# Altium footprint library AltiumLibraries.PcbLib: 247 footprints (part 2 of 16)
Each footprint in its own frame and in the unit in brackets; x right, y up, seen from the top. Pads: shape width x height; smd on the part's side, far side on the other; paste and mask are expansions set on the pad; w line width, h text height; cw(c..) or ccw(c..) is an arc to the next point about the centre after c.
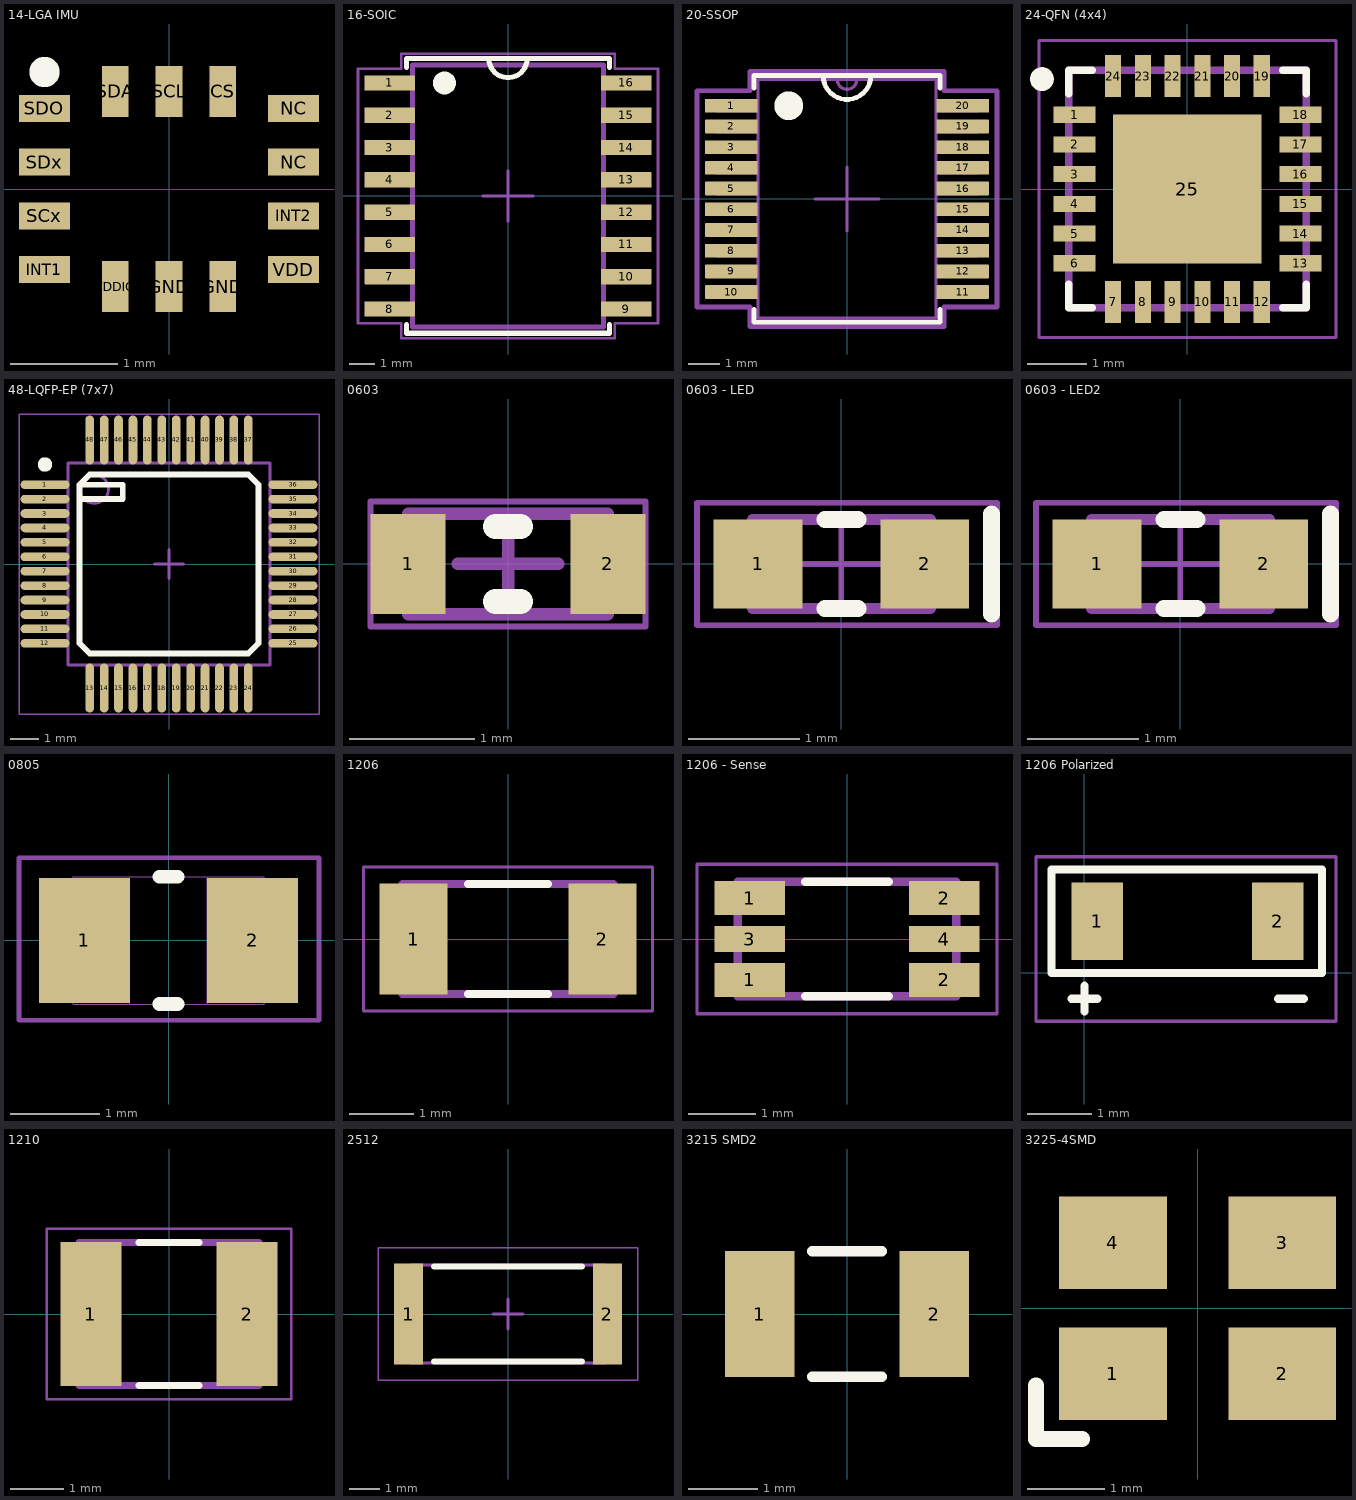
[diagram p1: the footprints below, top view; thin cyan lines are the x and y axes]

## 14-LGA IMU [mm] "Accelerometer, Gyroscope, Temperature, 6 Axis Sensor I²C, SPI Output"
height 0.86
pads (14):
  rect 0.25x0.475 smd mask+0.05: CS(0.5,0.91) GND(0,-0.91) GND(0.5,-0.91) SCL(0,0.91) SDA(-0.5,0.91) VDDIO(-0.5,-0.91)
  rect 0.475x0.25 smd mask+0.05: INT1(-1.16,-0.75) INT2(1.16,-0.25) NC(1.16,0.25) NC(1.16,0.75) SCx(-1.16,-0.25) SDO(-1.16,0.75) SDx(-1.16,0.25) VDD(1.16,-0.75)
Top Overlay:
  circle w0.254: c-1.16,1.09 r0.014
3D body: height 0.86, standoff 0.3, extent -1.5,-1.25 1.5,1.25

## 16-SOIC [mm]
pads (16):
  rrect10% 2x0.6 smd: 1(-4.65,4.445) 2(-4.65,3.175) 3(-4.65,1.905) 4(-4.65,0.635) 5(-4.65,-0.635) 6(-4.65,-1.905) 7(-4.65,-3.175) 8(-4.65,-4.445) 9(4.65,-4.445) 10(4.65,-3.175) 11(4.65,-1.905) 12(4.65,-0.635) 13(4.65,0.635) 14(4.65,1.905) 15(4.65,3.175) 16(4.65,4.445)
Top Overlay:
  circle w0.5: c-2.5,4.445 r0.2
  lines w0.2: -4,-5.05 -4,-5.4 4,-5.4 4,-5.05 ; -4,5.05 -4,5.4 4,5.4 4,5.05 ; -0.75,5.4 ccw(c0,5.4) 0.75,5.4
Mechanical 1:
  lines w0.2: -3.75,-5.15 3.75,-5.15 3.75,5.15 -3.75,5.15 -3.75,-5.15
Mechanical 15:
  lines w0.1: -1,0 0,0 ; 0,-1 0,0 ; 0,1 0,0 ; 1,0 0,0 ; -5.9,-5 -5.9,5 -4.2,5 -4.2,5.6 4.2,5.6 4.2,5 5.9,5 5.9,-5 4.2,-5 4.2,-5.6 -4.2,-5.6 -4.2,-5 -5.9,-5
3D body "DW0016A.stp": height 2.59, standoff 0, extent -5.167,-5.15 5.167,5.15

## 20-SSOP [mil]
pads (20):
  rrect10% 65x17 smd paste+0: 1(-142.92,115.16) 2(-142.92,89.57) 3(-142.92,63.98) 4(-142.92,38.39) 5(-142.92,12.8) 6(-142.92,-12.8) 7(-142.92,-38.39) 8(-142.92,-63.98) 9(-142.92,-89.57) 10(-142.92,-115.16) 11(142.92,-115.16) 12(142.92,-89.57) 13(142.92,-63.98) 14(142.92,-38.39) 15(142.92,-12.8) 16(142.92,12.8) 17(142.92,38.39) 18(142.92,63.98) 19(142.92,89.57) 20(142.92,115.16)
Top Overlay:
  circle w19.68: c-72,115.16 r7.87
  lines w5.98: -29.53,152.5 ccw(c0,152.5) 29.53,152.5
  lines w6: -115,-136.76 -115,-152.5 115,-152.5 115,-136.76 ; -115,136.76 -115,152.5 115,152.5 115,136.76
Mechanical 13:
  lines w1: -161.42,-122.66 -161.42,-107.66 -110,-107.66 -110,-122.66 -161.42,-122.66 ; -161.42,-97.07 -161.42,-82.07 -110,-82.07 -110,-97.07 -161.42,-97.07 ; -161.42,-71.48 -161.42,-56.48 -110,-56.48 -110,-71.48 -161.42,-71.48 ; -161.42,-45.89 -161.42,-30.89 -110,-30.89 -110,-45.89 -161.42,-45.89 ; -161.42,-20.3 -161.42,-5.3 -110,-5.3 -110,-20.3 -161.42,-20.3 ; -161.42,5.3 -161.42,20.3 -110,20.3 -110,5.3 -161.42,5.3 ; -161.42,30.89 -161.42,45.89 -110,45.89 -110,30.89 -161.42,30.89 ; -161.42,56.48 -161.42,71.48 -110,71.48 -110,56.48 -161.42,56.48 ; -161.42,82.07 -161.42,97.07 -110,97.07 -110,82.07 -161.42,82.07 ; -161.42,107.66 -161.42,122.66 -110,122.66 -110,107.66 -161.42,107.66 ; 110,-122.66 110,-107.66 161.42,-107.66 161.42,-122.66 110,-122.66 ; 110,-97.07 110,-82.07 161.42,-82.07 161.42,-97.07 110,-97.07 ; 110,-71.48 110,-56.48 161.42,-56.48 161.42,-71.48 110,-71.48 ; 110,-45.89 110,-30.89 161.42,-30.89 161.42,-45.89 110,-45.89 ; 110,-20.3 110,-5.3 161.42,-5.3 161.42,-20.3 110,-20.3 ; 110,5.3 110,20.3 161.42,20.3 161.42,5.3 110,5.3 ; 110,30.89 110,45.89 161.42,45.89 161.42,30.89 110,30.89 ; 110,56.48 110,71.48 161.42,71.48 161.42,56.48 110,56.48 ; 110,82.07 110,97.07 161.42,97.07 161.42,82.07 110,82.07 ; 110,107.66 110,122.66 161.42,122.66 161.42,107.66 110,107.66
  lines w3.94: -12,147.5 ccw(c0,147.5) 12,147.5 ; -110,-147.5 110,-147.5 110,147.5 -110,147.5 -110,-147.5
Mechanical 15:
  lines w3.94: -39.37,0 0,0 ; 0,-39.37 0,0 ; 0,39.37 0,0 ; 39.37,0 0,0
  lines w6: -185.42,-133.66 -185.42,133.66 -120,133.66 -120,157.5 120,157.5 120,133.66 185.42,133.66 185.42,-133.66 120,-133.66 120,-157.5 -120,-157.5 -120,-133.66 -185.42,-133.66
3D body: height 10, standoff 0, extent 0,0 10,10

## 24-QFN (4x4) [mm]
pads (25):
  rect 0.71x0.27 smd: 1(-1.9,1.25) 2(-1.9,0.75) 3(-1.9,0.25) 4(-1.9,-0.25) 5(-1.9,-0.75) 6(-1.9,-1.25) 13(1.9,-1.25) 14(1.9,-0.75) 15(1.9,-0.25) 16(1.9,0.25) 17(1.9,0.75) 18(1.9,1.25)
  rect 0.27x0.71 smd: 7(-1.25,-1.9) 8(-0.75,-1.9) 9(-0.25,-1.9) 10(0.25,-1.9) 11(0.75,-1.9) 12(1.25,-1.9) 19(1.25,1.9) 20(0.75,1.9) 21(0.25,1.9) 22(-0.25,1.9) 23(-0.75,1.9) 24(-1.25,1.9)
  rect 2.5x2.5 smd: 25(0,0)
Top Overlay:
  circle w0.2: c-2.45,1.85 r0.1
  lines w0.127: -2,-1.6 -2,-2 -1.6,-2 ; -2,1.6 -2,2 -1.6,2 ; 1.6,-2 2,-2 2,-1.6 ; 1.6,2 2,2 2,1.6
Top Paste:
  region: -1.103,-0.1 -0.1,-0.1 -0.1,-1.103 -1.103,-1.103
  region: 0.1,-0.1 1.1,-0.1 1.1,-1.102 0.1,-1.102
  region: 0.1,1.1 1.1,1.1 1.1,0.1 0.1,0.1
  region: -1.103,1.1 -0.1,1.1 -0.1,0.1 -1.103,0.1
Mechanical 4:
  lines w0.127: -2,-2 2,-2 ; -2,-2 -2,2 ; -2,-2 2,-2 ; -2,-2 -2,2 ; -2,2 2,2 ; -2,2 2,2 ; 2,-2 2,2 ; 2,-2 2,2
Mechanical 15:
  lines w0.05: -2.5,-2.5 -2.5,2.5 2.5,2.5 2.5,-2.5 -2.5,-2.5
3D body "LAN8742ACZTR.step": height 1.4, standoff 0, extent -2.045,-2.045 2.045,2.045

## 48-LQFP-EP (7x7) [mm]
pads (48):
  oval 1.7x0.3 smd: 1(-4.3,2.75) 2(-4.3,2.25) 3(-4.3,1.75) 4(-4.3,1.25) 5(-4.3,0.75) 6(-4.3,0.25) 7(-4.3,-0.25) 8(-4.3,-0.75) 9(-4.3,-1.25) 10(-4.3,-1.75) 11(-4.3,-2.25) 12(-4.3,-2.75) 25(4.3,-2.75) 26(4.3,-2.25) 27(4.3,-1.75) 28(4.3,-1.25) 29(4.3,-0.75) 30(4.3,-0.25) 31(4.3,0.25) 32(4.3,0.75) 33(4.3,1.25) 34(4.3,1.75) 35(4.3,2.25) 36(4.3,2.75)
  oval 0.3x1.7 smd: 13(-2.75,-4.3) 14(-2.25,-4.3) 15(-1.75,-4.3) 16(-1.25,-4.3) 17(-0.75,-4.3) 18(-0.25,-4.3) 19(0.25,-4.3) 20(0.75,-4.3) 21(1.25,-4.3) 22(1.75,-4.3) 23(2.25,-4.3) 24(2.75,-4.3) 37(2.75,4.3) 38(2.25,4.3) 39(1.75,4.3) 40(1.25,4.3) 41(0.75,4.3) 42(0.25,4.3) 43(-0.25,4.3) 44(-0.75,4.3) 45(-1.25,4.3) 46(-1.75,4.3) 47(-2.25,4.3) 48(-2.75,4.3)
Top Overlay:
  circle w0.25: c-4.3,3.45 r0.125
  lines w0.2: -3.1,2.25 -1.6,2.25 -1.6,2.75 -3.1,2.75 ; -3.1,2.75 -3.1,-2.75 -2.75,-3.1 2.75,-3.1 3.1,-2.75 3.1,2.75 2.75,3.1 -2.75,3.1 -3.1,2.75
Mechanical 13:
  circle w0.1: c-2.6,2.6 r0.5
  lines w0.1: -3.5,-3.5 -3.5,3.5 3.5,3.5 3.5,-3.5 -3.5,-3.5
Mechanical 15:
  lines w0.05: -5.2,-5.2 -5.2,5.2 5.2,5.2 5.2,-5.2 -5.2,-5.2
  lines w0.1: -0.5,0 0.5,0 ; 0,-0.5 0,0.5
3D body: height 1.6, standoff 0.1, extent -3.5,-3.5 3.5,3.5

## 0603 [mm] "Chip Resistor, 2-Leads, Body 1.60x0.80mm, IPC High Density"
height 0.6
pads (2):
  rect 0.6x0.8 smd mask+0.1: 1(-0.8,0) 2(0.8,0)
Top Overlay:
  lines w0.2: -0.1,-0.3 0.1,-0.3 ; -0.1,0.3 0.1,0.3
Mechanical 13:
  lines w0.1: -0.8,-0.4 0.8,-0.4 0.8,0.4 -0.8,0.4 -0.8,-0.4
Mechanical 15:
  lines w0.05: -1.1,-0.5 1.1,-0.5 1.1,0.5 -1.1,0.5 -1.1,-0.5
  lines w0.1: -0.4,0 0.4,0 ; 0,-0.4 0,0.4
3D body: height 0.6, standoff 0, extent 0.6,-0.4 0.8,0.4
3D body: height 0.6, standoff 0, extent -0.8,-0.4 -0.6,0.4
3D body: height 0.6, standoff 0, extent -0.6,-0.4 0.6,0.4

## 0603 - LED [mm]
pads (2):
  rect 0.8x0.8 smd: 1(-0.75,0) 2(0.75,0)
Top Overlay:
  lines w0.152: -0.15,-0.4 0.15,-0.4 ; -0.15,0.4 0.15,0.4 ; 1.35,-0.45 1.35,0.45
Mechanical 13:
  lines w0.1: -0.8,-0.4 -0.8,0.4 0.8,0.4 0.8,-0.4 -0.8,-0.4
Mechanical 15:
  lines w0.05: -0.4,0 0.4,0 ; 0,-0.4 0,0.4 ; -1.3,-0.55 1.4,-0.55 1.4,0.55 -1.3,0.55 -1.3,-0.55
3D body "0603 - LED.STEP": height 0.65, standoff 0, extent -0.8,-0.4 0.8,0.4

## 0603 - LED2 [mm]
pads (2):
  rect 0.8x0.8 smd: 1(-0.75,0) 2(0.75,0)
Top Overlay:
  lines w0.152: -0.15,-0.4 0.15,-0.4 ; -0.15,0.4 0.15,0.4 ; 1.35,-0.45 1.35,0.45
Mechanical 13:
  lines w0.1: -0.8,-0.4 -0.8,0.4 0.8,0.4 0.8,-0.4 -0.8,-0.4
Mechanical 15:
  lines w0.05: -0.4,0 0.4,0 ; 0,-0.4 0,0.4 ; -1.3,-0.55 1.4,-0.55 1.4,0.55 -1.3,0.55 -1.3,-0.55
3D body "0603 - LED.STEP": height 0.65, standoff 0, extent -0.8,-0.4 0.8,0.4

## 0805 [mil]
pads (2):
  rect 40x55 smd: 1(-37,0) 2(37,0)
Top Overlay:
  lines w6: -4,-28 4,-28 ; -4,28 4,28
Mechanical 13:
  lines w0: -17,-28 17,-28 ; -17,-28 -42,-28 -42,28 -17,28 ; -17,-28 -17,28 ; -17,28 17,28 ; 17,-28 42,-28 42,28 17,28 ; 17,-28 17,28
Mechanical 15:
  lines w2.01: -65.75,-35.04 66.14,-35.04 66.14,36.22 -65.75,36.22 -65.75,-35.04
3D body: height 23.62, standoff 0, extent -47.24,-27.56 47.24,27.56

## 1206 [mm]
pads (2):
  rect 1.05x1.72 smd: 1(-1.46,0) 2(1.46,0)
Top Overlay:
  lines w0.127: -0.62,-0.85 0.62,-0.85 ; -0.62,0.85 0.62,0.85
Mechanical 13:
  lines w0.127: -1.63,-0.85 -1.63,0.85 1.63,0.85 1.63,-0.85 -1.63,-0.85
Mechanical 15:
  lines w0.05: -2.235,-1.112 -2.235,1.112 2.235,1.112 2.235,-1.112 -2.235,-1.112
3D body "1206.STEP": height 1.61, standoff 0.01, extent -1.6,-0.8 1.6,0.8

## 1206 - Sense [mil] "4-Wire Sense Footprint"
pads (6):
  rect 41.34x20 smd: 1(-57,-24) 1(-57,24) 2(57,-24) 2(57,24)
  rect 41.34x15 smd paste+0: 3(-57,0) 4(57,0)
Top Overlay:
  lines w5: -24.41,-33.46 24.41,-33.46 ; -24.41,33.46 24.41,33.46
Mechanical 13:
  lines w5: -64.17,-33.46 -64.17,33.46 64.17,33.46 64.17,-33.46 -64.17,-33.46
Mechanical 15:
  lines w1.97: -87.99,-43.78 -87.99,43.78 87.99,43.78 87.99,-43.78 -87.99,-43.78

## 1206 Polarized [mm]
pads (2):
  rect 0.8x1.2 smd: 1(0.2,0.8) 2(3,0.8)
Top Overlay:
  lines w0.127: -0.2,-0.4 0.2,-0.4 ; 0,-0.6 0,-0.2 ; 3,-0.4 3.4,-0.4 ; -0.508,0 -0.508,1.6 3.683,1.6 3.683,0 -0.508,0
Mechanical 15:
  lines w0.05: -0.75,-0.75 3.9,-0.75 3.9,1.8 -0.75,1.8 -0.75,1.5 -0.75,-0.75

## 1210 [mm]
pads (2):
  rect 1.16x2.72 smd: 1(-1.475,0) 2(1.475,0)
Top Overlay:
  lines w0.127: -0.57,-1.35 0.57,-1.35 ; -0.57,1.35 0.57,1.35
Mechanical 4:
  lines w0.127: -1.7,-1.35 1.7,-1.35 ; -1.7,-1.35 -1.7,1.35 ; -1.7,-1.35 1.7,-1.35 ; -1.7,-1.35 -1.7,1.35 ; -1.7,1.35 1.7,1.35 ; -1.7,1.35 1.7,1.35 ; 1.7,-1.35 1.7,1.35 ; 1.7,-1.35 1.7,1.35
Mechanical 15:
  lines w0.05: -2.308,-1.608 -2.308,1.608 2.308,1.608 2.308,-1.608 -2.308,-1.608
3D body "1210.STEP": height 1.61, standoff 0.01, extent -1.6,-1.25 1.6,1.25

## 2512 [mm] "Chip Resistor, 2-Leads, Body 6.35x3.10mm, IPC Low Density"
height 0.6
pads (2):
  rect 0.95x3.35 smd: 1(-3.3,0) 2(3.3,0)
Top Overlay:
  lines w0.2: -2.45,-1.575 2.45,-1.575 ; -2.45,1.575 2.45,1.575
Mechanical 13:
  lines w0.1: -3.225,-1.625 -3.225,1.625 3.225,1.625 3.225,-1.625 -3.225,-1.625
Mechanical 15:
  lines w0.05: -4.3,-2.2 -4.3,2.2 4.3,2.2 4.3,-2.2 -4.3,-2.2
  lines w0.1: -0.5,0 0.5,0 ; 0,-0.5 0,0.5
3D body: height 0.6, standoff 0, extent -3.025,-1.625 3.025,1.625
3D body: height 0.6, standoff 0, extent -3.225,-1.625 -3.025,1.625
3D body: height 0.6, standoff 0, extent 3.025,-1.625 3.225,1.625

## 3215 SMD2 [mm] "3.2 x 1.5mm 2Lead"
pads (2):
  rect 1x1.8 smd: 1(-1.25,0) 2(1.25,0)
Top Overlay:
  lines w0.152: -0.5,-0.9 0.5,-0.9 ; -0.5,0.9 0.5,0.9
3D body "User Library-ABS07.STEP": height 0.91, standoff 0, extent -1.61,-0.76 1.61,0.76

## 3225-4SMD [mm] "3225 4PIn Package"
pads (4):
  rect 1.4x1.2 smd: 1(-1.1,-0.85) 2(1.1,-0.85) 3(1.1,0.85) 4(-1.1,0.85)
Top Overlay:
  lines w0.203: -2.1,-1 -2.1,-1.7 -1.5,-1.7
3D body "User Library-3225-1.step": height 0.61, standoff 0, extent -1.6,-1.2 1.6,1.3